# Altium schematic symbol library TI - ADC.SchLib: 2198 symbols (part 18 of 130)
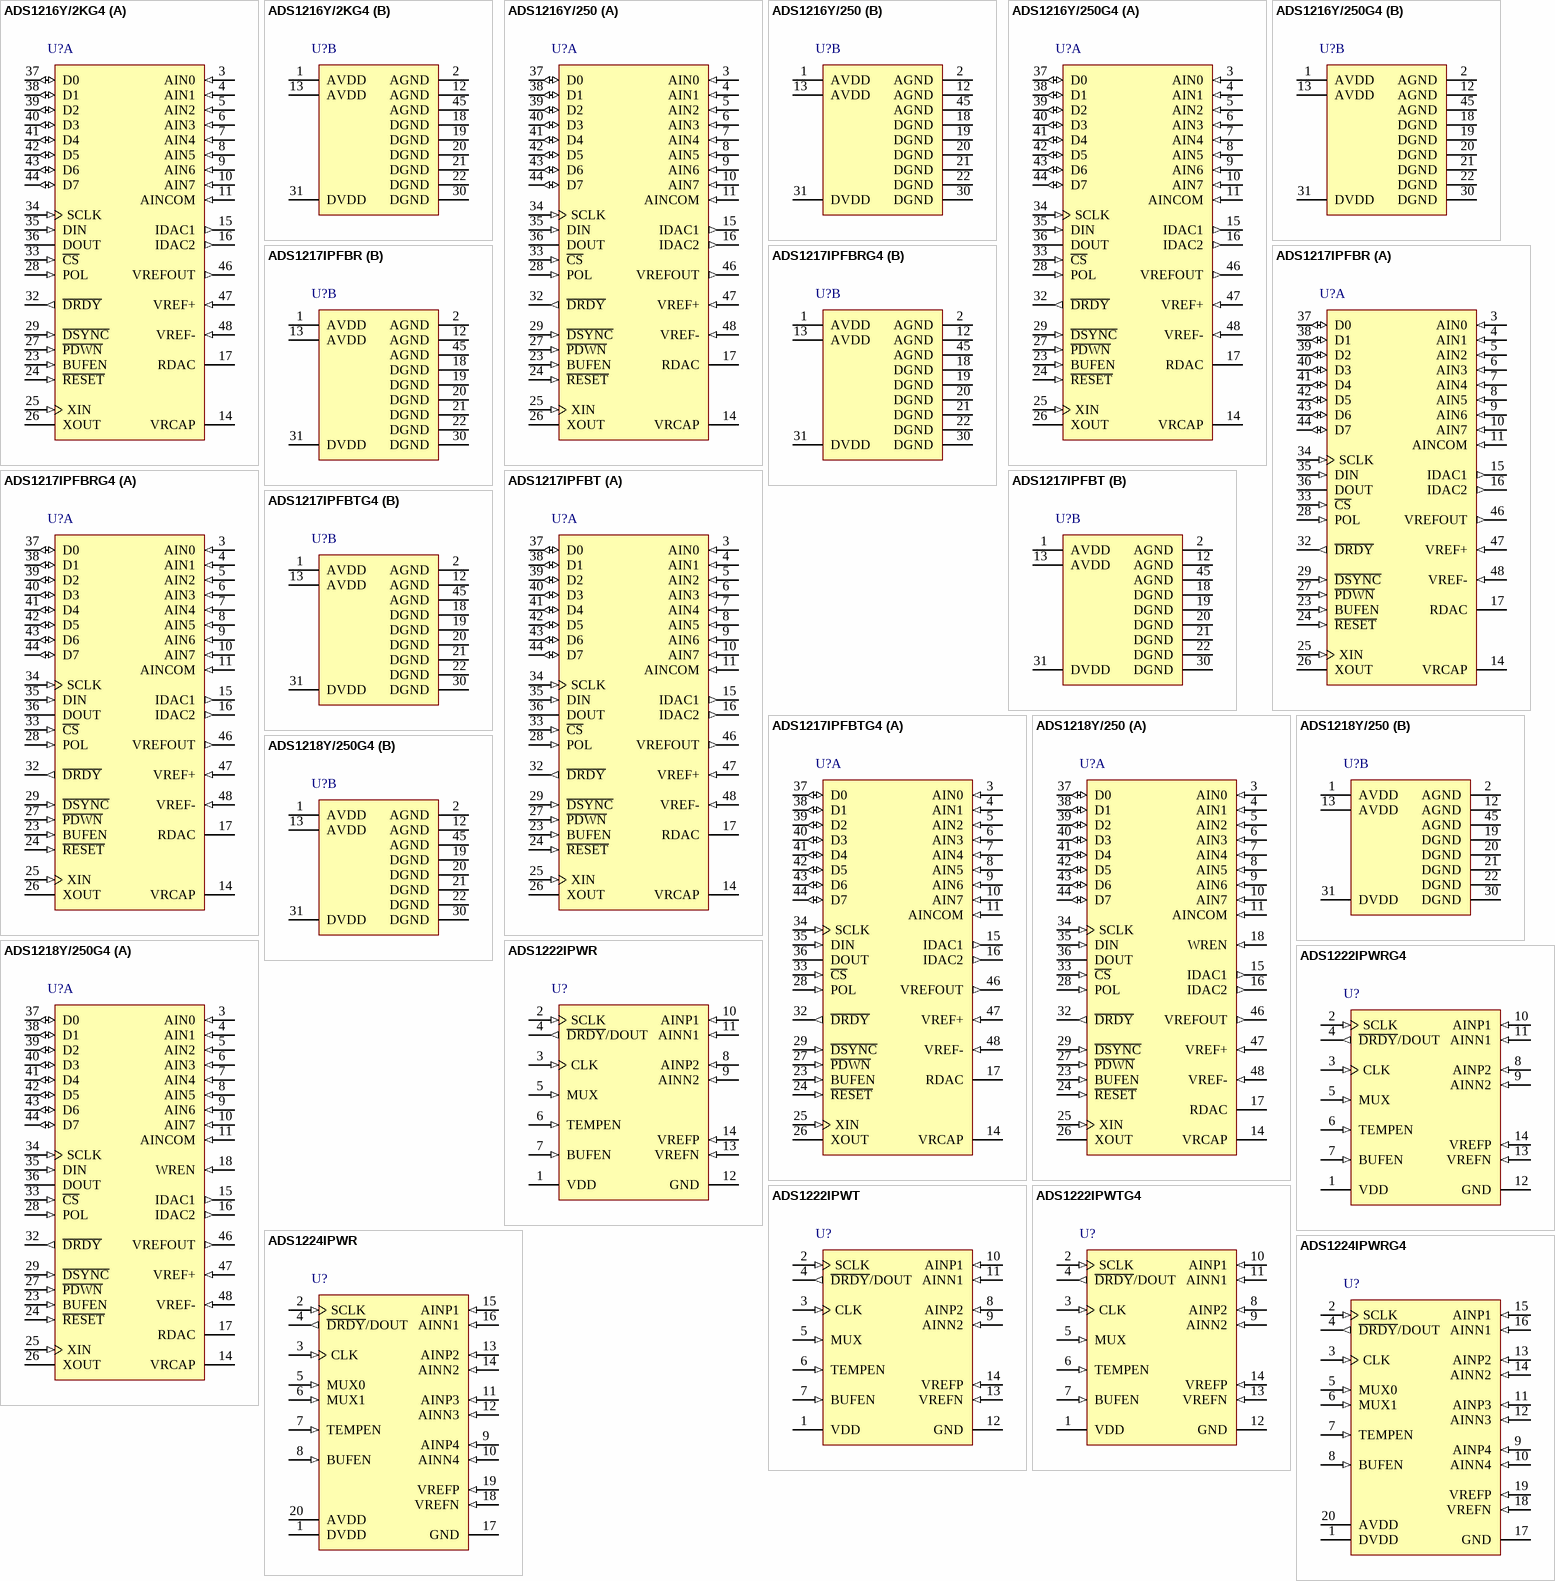
[diagram p143: symbols ADS1216Y/2KG4 to ADS1224IPWRG4]

## ADS1216Y/2KG4
designator U?
24-Bit ADC, -40 to 85 degC, 48-pin QFP (PFB48), Green (RoHS & no Sb/Br); Manufacturer: Texas Instruments; PartNumber: ADS1216Y/2KG4; # Input Channels: 8; Analog Voltage AV/DD(Max)(V): 5.25; Analog Voltage AV/DD(Min)(V): 2.7; Architecture: Delta-Sigma; ENOB(Bits): 22; Interface: Serial SPI; Resolution(Bits): 24; Sample Rate (max)(SPS): 780; SubFamily: Precision ADC (<=10MSPS); DatasheetVersion: SBAS171D; PackageVersion: 4073176/B, 10/1996; PackageReference: PFB48; PackageDescription: 48-Pin Plastic Flat Pack, Body 7 x 7 mm, Pitch 0.5 mm; Supplier 1: Digi-Key; Supplier Part Number 1: ADS8344NG4-ND; Digital Supply(Max)(V): 5.25; Digital Supply(Min)(V): 2.7; Eco-Plan: Green (RoHS & no Sb/Br); Mounting Technology: Surface Mount; Code_JEDEC: MS-026; ComponentLink1Description: Manufacturer URL; ComponentLink1URL: http://www.ti.com/; ComponentLink2Description: Datasheet; ComponentLink2URL: http://www.ti.com/general/docs/lit/getliterature.tsp?genericPartNumber=ADS1216&fileType=pdf; ComponentLink3Description: Package Specification; ComponentLink3URL: http://www.ti.com/lit/ml/mtqf019a/mtqf019a.pdf
footprint TI-PFB48_N (QFP, 48-Leads, Body 7x7mm, Pitch 0.5mm, IPC Medium Density)
footprint TI-PFB48_L (QFP, 48-Leads, Body 7x7mm, Pitch 0.5mm, IPC High Density)
footprint TI-PFB48_M (QFP, 48-Leads, Body 7x7mm, Pitch 0.5mm, IPC Low Density)
part A pins: 3 AIN0 (in) "Analog Input 0", 4 AIN1 (in) "Analog Input 1", 5 AIN2 (in) "Analog Input 2", 6 AIN3 (in) "Analog Input 3", 7 AIN4 (in) "Analog Input 4", 8 AIN5 (in) "Analog Input 5", 9 AIN6 (in) "Analog Input 6", 10 AIN7 (in) "Analog Input 7", 11 AINCOM (in) "Analog Input Common", 14 VRCAP "VREFOUT Bypass Capacitor", 15 IDAC1 (out) "Current DAC1 Output", 16 IDAC2 (out) "Current DAC2 Output", 17 RDAC "Current DAC Resistor", 23 BUFEN (in) "Buffer Enable Input", 24 ~{RESET} (in) "Active LOW, resets the entire chip.", 25 XIN (in) "Clock Input", 26 XOUT "Clock Output, used with crystal or resonator.", 27 ~{PDWN} (in) "Active LOW. Power Down. The power-down function shuts down the analog and digital circuits", 28 POL (in) "Serial Clock Polarity Input", 29 ~{DSYNC} (in) "Active LOW, Synchronization Control Input", 32 ~{DRDY} (out) "Active LOW, Data Ready Output", 33 ~{CS} (in) "Active LOW, Chip Select Input", 34 SCLK (in) "Serial Clock, Schmitt Trigger", 35 DIN (in) "Serial Data Input, Schmitt Trigger", 36 DOUT (hiz) "Serial Data Output", 37 D0 (io) "Digital I/O 0", 38 D1 (io) "Digital I/O 1", 39 D2 (io) "Digital I/O 2", 40 D3 (io) "Digital I/O 3", 41 D4 (io) "Digital I/O 4", 42 D5 (io) "Digital I/O 5", 43 D6 (io) "Digital I/O 6", 44 D7 (io) "Digital I/O 7", 46 VREFOUT (out) "Voltage Reference Output", 47 VREF+ (in) "Positive Differential Reference Input", 48 VREF- (in) "Negative Differential Reference Input"
part B pins: 1 AVDD (power) "Analog Power Supply", 2 AGND (power) "Analog Ground", 12 AGND (power) "Analog Ground", 13 AVDD (power) "Analog Power Supply", 18 DGND (power) "Digital Ground", 19 DGND (power) "Digital Ground", 20 DGND (power) "Digital Ground", 21 DGND (power) "Digital Ground", 22 DGND (power) "Digital Ground", 30 DGND (power) "Digital Ground", 31 DVDD (power) "Digital Power Supply", 45 AGND (power) "Analog Ground"

## ADS1216Y/250
designator U?
24-Bit ADC, -40 to 85 degC, 48-pin QFP (PFB48), Green (RoHS & no Sb/Br); Manufacturer: Texas Instruments; PartNumber: ADS1216Y/250; # Input Channels: 8; Analog Voltage AV/DD(Max)(V): 5.25; Analog Voltage AV/DD(Min)(V): 2.7; Architecture: Delta-Sigma; ENOB(Bits): 22; Interface: Serial SPI; Resolution(Bits): 24; Sample Rate (max)(SPS): 780; SubFamily: Precision ADC (<=10MSPS); DatasheetVersion: SBAS171D; PackageVersion: 4073176/B, 10/1996; PackageReference: PFB48; PackageDescription: 48-Pin Plastic Flat Pack, Body 7 x 7 mm, Pitch 0.5 mm; Supplier 1: Digi-Key; Supplier Part Number 1: ADS1254E/2K5TR-ND; Digital Supply(Max)(V): 5.25; Digital Supply(Min)(V): 2.7; Eco-Plan: Green (RoHS & no Sb/Br); Mounting Technology: Surface Mount; Code_JEDEC: MS-026; ComponentLink1Description: Manufacturer URL; ComponentLink1URL: http://www.ti.com/; ComponentLink2Description: Datasheet; ComponentLink2URL: http://www.ti.com/general/docs/lit/getliterature.tsp?genericPartNumber=ADS1216&fileType=pdf; ComponentLink3Description: Package Specification; ComponentLink3URL: http://www.ti.com/lit/ml/mtqf019a/mtqf019a.pdf
footprint TI-PFB48_N (QFP, 48-Leads, Body 7x7mm, Pitch 0.5mm, IPC Medium Density)
footprint TI-PFB48_L (QFP, 48-Leads, Body 7x7mm, Pitch 0.5mm, IPC High Density)
footprint TI-PFB48_M (QFP, 48-Leads, Body 7x7mm, Pitch 0.5mm, IPC Low Density)
part A pins: 3 AIN0 (in) "Analog Input 0", 4 AIN1 (in) "Analog Input 1", 5 AIN2 (in) "Analog Input 2", 6 AIN3 (in) "Analog Input 3", 7 AIN4 (in) "Analog Input 4", 8 AIN5 (in) "Analog Input 5", 9 AIN6 (in) "Analog Input 6", 10 AIN7 (in) "Analog Input 7", 11 AINCOM (in) "Analog Input Common", 14 VRCAP "VREFOUT Bypass Capacitor", 15 IDAC1 (out) "Current DAC1 Output", 16 IDAC2 (out) "Current DAC2 Output", 17 RDAC "Current DAC Resistor", 23 BUFEN (in) "Buffer Enable Input", 24 ~{RESET} (in) "Active LOW, resets the entire chip.", 25 XIN (in) "Clock Input", 26 XOUT "Clock Output, used with crystal or resonator.", 27 ~{PDWN} (in) "Active LOW. Power Down. The power-down function shuts down the analog and digital circuits", 28 POL (in) "Serial Clock Polarity Input", 29 ~{DSYNC} (in) "Active LOW, Synchronization Control Input", 32 ~{DRDY} (out) "Active LOW, Data Ready Output", 33 ~{CS} (in) "Active LOW, Chip Select Input", 34 SCLK (in) "Serial Clock, Schmitt Trigger", 35 DIN (in) "Serial Data Input, Schmitt Trigger", 36 DOUT (hiz) "Serial Data Output", 37 D0 (io) "Digital I/O 0", 38 D1 (io) "Digital I/O 1", 39 D2 (io) "Digital I/O 2", 40 D3 (io) "Digital I/O 3", 41 D4 (io) "Digital I/O 4", 42 D5 (io) "Digital I/O 5", 43 D6 (io) "Digital I/O 6", 44 D7 (io) "Digital I/O 7", 46 VREFOUT (out) "Voltage Reference Output", 47 VREF+ (in) "Positive Differential Reference Input", 48 VREF- (in) "Negative Differential Reference Input"
part B pins: 1 AVDD (power) "Analog Power Supply", 2 AGND (power) "Analog Ground", 12 AGND (power) "Analog Ground", 13 AVDD (power) "Analog Power Supply", 18 DGND (power) "Digital Ground", 19 DGND (power) "Digital Ground", 20 DGND (power) "Digital Ground", 21 DGND (power) "Digital Ground", 22 DGND (power) "Digital Ground", 30 DGND (power) "Digital Ground", 31 DVDD (power) "Digital Power Supply", 45 AGND (power) "Analog Ground"

## ADS1216Y/250G4
designator U?
24-Bit ADC, -40 to 85 degC, 48-pin QFP (PFB48), Green (RoHS & no Sb/Br); Manufacturer: Texas Instruments; PartNumber: ADS1216Y/250G4; # Input Channels: 8; Analog Voltage AV/DD(Max)(V): 5.25; Analog Voltage AV/DD(Min)(V): 2.7; Architecture: Delta-Sigma; ENOB(Bits): 22; Interface: Serial SPI; Resolution(Bits): 24; Sample Rate (max)(SPS): 780; SubFamily: Precision ADC (<=10MSPS); DatasheetVersion: SBAS171D; PackageVersion: 4073176/B, 10/1996; PackageReference: PFB48; PackageDescription: 48-Pin Plastic Flat Pack, Body 7 x 7 mm, Pitch 0.5 mm; Supplier 1: Digi-Key; Supplier Part Number 1: ADS1254E/2K5G4-ND; Digital Supply(Max)(V): 5.25; Digital Supply(Min)(V): 2.7; Eco-Plan: Green (RoHS & no Sb/Br); Mounting Technology: Surface Mount; Code_JEDEC: MS-026; ComponentLink1Description: Manufacturer URL; ComponentLink1URL: http://www.ti.com/; ComponentLink2Description: Datasheet; ComponentLink2URL: http://www.ti.com/general/docs/lit/getliterature.tsp?genericPartNumber=ADS1216&fileType=pdf; ComponentLink3Description: Package Specification; ComponentLink3URL: http://www.ti.com/lit/ml/mtqf019a/mtqf019a.pdf
footprint TI-PFB48_N (QFP, 48-Leads, Body 7x7mm, Pitch 0.5mm, IPC Medium Density)
footprint TI-PFB48_L (QFP, 48-Leads, Body 7x7mm, Pitch 0.5mm, IPC High Density)
footprint TI-PFB48_M (QFP, 48-Leads, Body 7x7mm, Pitch 0.5mm, IPC Low Density)
part A pins: 3 AIN0 (in) "Analog Input 0", 4 AIN1 (in) "Analog Input 1", 5 AIN2 (in) "Analog Input 2", 6 AIN3 (in) "Analog Input 3", 7 AIN4 (in) "Analog Input 4", 8 AIN5 (in) "Analog Input 5", 9 AIN6 (in) "Analog Input 6", 10 AIN7 (in) "Analog Input 7", 11 AINCOM (in) "Analog Input Common", 14 VRCAP "VREFOUT Bypass Capacitor", 15 IDAC1 (out) "Current DAC1 Output", 16 IDAC2 (out) "Current DAC2 Output", 17 RDAC "Current DAC Resistor", 23 BUFEN (in) "Buffer Enable Input", 24 ~{RESET} (in) "Active LOW, resets the entire chip.", 25 XIN (in) "Clock Input", 26 XOUT "Clock Output, used with crystal or resonator.", 27 ~{PDWN} (in) "Active LOW. Power Down. The power-down function shuts down the analog and digital circuits", 28 POL (in) "Serial Clock Polarity Input", 29 ~{DSYNC} (in) "Active LOW, Synchronization Control Input", 32 ~{DRDY} (out) "Active LOW, Data Ready Output", 33 ~{CS} (in) "Active LOW, Chip Select Input", 34 SCLK (in) "Serial Clock, Schmitt Trigger", 35 DIN (in) "Serial Data Input, Schmitt Trigger", 36 DOUT (hiz) "Serial Data Output", 37 D0 (io) "Digital I/O 0", 38 D1 (io) "Digital I/O 1", 39 D2 (io) "Digital I/O 2", 40 D3 (io) "Digital I/O 3", 41 D4 (io) "Digital I/O 4", 42 D5 (io) "Digital I/O 5", 43 D6 (io) "Digital I/O 6", 44 D7 (io) "Digital I/O 7", 46 VREFOUT (out) "Voltage Reference Output", 47 VREF+ (in) "Positive Differential Reference Input", 48 VREF- (in) "Negative Differential Reference Input"
part B pins: 1 AVDD (power) "Analog Power Supply", 2 AGND (power) "Analog Ground", 12 AGND (power) "Analog Ground", 13 AVDD (power) "Analog Power Supply", 18 DGND (power) "Digital Ground", 19 DGND (power) "Digital Ground", 20 DGND (power) "Digital Ground", 21 DGND (power) "Digital Ground", 22 DGND (power) "Digital Ground", 30 DGND (power) "Digital Ground", 31 DVDD (power) "Digital Power Supply", 45 AGND (power) "Analog Ground"

## ADS1217IPFBR
designator U?
8-Channel, 24-Bit ADC, -40 to 85 degC, 48-pin QFP (PFB48), Green (RoHS & no Sb/Br); Manufacturer: Texas Instruments; PartNumber: ADS1217IPFBR; # Input Channels: 8; Analog Voltage AV/DD(Max)(V): 5.25; Analog Voltage AV/DD(Min)(V): 2.7; Architecture: Delta-Sigma; ENOB(Bits): 22; Interface: Serial SPI; Resolution(Bits): 24; Sample Rate (max)(SPS): 780; SubFamily: Precision ADC (<=10MSPS); DatasheetVersion: SBAS260C; PackageVersion: 4073176/B, 10/1996; PackageReference: PFB48; PackageDescription: 48-Pin Plastic Flat Pack, Body 7 x 7 mm, Pitch 0.5 mm; Supplier 1: Digi-Key; Supplier Part Number 1: ADS1254EG4-ND; Digital Supply(Max)(V): 5.25; Digital Supply(Min)(V): 2.7; Eco-Plan: Green (RoHS & no Sb/Br); Mounting Technology: Surface Mount; Code_JEDEC: MS-026; ComponentLink1Description: Manufacturer URL; ComponentLink1URL: http://www.ti.com/; ComponentLink2Description: Datasheet; ComponentLink2URL: http://www.ti.com/general/docs/lit/getliterature.tsp?genericPartNumber=ADS1217&fileType=pdf; ComponentLink3Description: Package Specification; ComponentLink3URL: http://www.ti.com/lit/ml/mtqf019a/mtqf019a.pdf
footprint TI-PFB48_N (QFP, 48-Leads, Body 7x7mm, Pitch 0.5mm, IPC Medium Density)
footprint TI-PFB48_L (QFP, 48-Leads, Body 7x7mm, Pitch 0.5mm, IPC High Density)
footprint TI-PFB48_M (QFP, 48-Leads, Body 7x7mm, Pitch 0.5mm, IPC Low Density)
part A pins: 3 AIN0 (in) "Analog Input 0", 4 AIN1 (in) "Analog Input 1", 5 AIN2 (in) "Analog Input 2", 6 AIN3 (in) "Analog Input 3", 7 AIN4 (in) "Analog Input 4", 8 AIN5 (in) "Analog Input 5", 9 AIN6 (in) "Analog Input 6", 10 AIN7 (in) "Analog Input 7", 11 AINCOM (in) "Analog Input Common", 14 VRCAP "VREFOUT Bypass Capacitor", 15 IDAC1 (out) "Current DAC1 Output", 16 IDAC2 (out) "Current DAC2 Output", 17 RDAC "Current DAC Resistor", 23 BUFEN (in) "Buffer Enable Input", 24 ~{RESET} (in) "Active LOW, resets the entire chip.", 25 XIN (in) "Clock Input", 26 XOUT "Clock Output, used with crystal or resonator.", 27 ~{PDWN} (in) "Active LOW. Power Down. The power-down function shuts down the analog and digital circuits", 28 POL (in) "Serial Clock Polarity Input", 29 ~{DSYNC} (in) "Active LOW, Synchronization Control Input", 32 ~{DRDY} (out) "Active LOW, Data Ready Output", 33 ~{CS} (in) "Active LOW, Chip Select Input", 34 SCLK (in) "Serial Clock, Schmitt Trigger", 35 DIN (in) "Serial Data Input, Schmitt Trigger", 36 DOUT (hiz) "Serial Data Output", 37 D0 (io) "Digital I/O 0", 38 D1 (io) "Digital I/O 1", 39 D2 (io) "Digital I/O 2", 40 D3 (io) "Digital I/O 3", 41 D4 (io) "Digital I/O 4", 42 D5 (io) "Digital I/O 5", 43 D6 (io) "Digital I/O 6", 44 D7 (io) "Digital I/O 7", 46 VREFOUT (out) "Voltage Reference Output", 47 VREF+ (in) "Positive Differential Reference Input", 48 VREF- (in) "Negative Differential Reference Input"
part B pins: 1 AVDD (power) "Analog Power Supply", 2 AGND (power) "Analog Ground", 12 AGND (power) "Analog Ground", 13 AVDD (power) "Analog Power Supply", 18 DGND (power) "Digital Ground", 19 DGND (power) "Digital Ground", 20 DGND (power) "Digital Ground", 21 DGND (power) "Digital Ground", 22 DGND (power) "Digital Ground", 30 DGND (power) "Digital Ground", 31 DVDD (power) "Digital Power Supply", 45 AGND (power) "Analog Ground"

## ADS1217IPFBRG4
designator U?
8-Channel, 24-Bit ADC, -40 to 85 degC, 48-pin QFP (PFB48), Green (RoHS & no Sb/Br); Manufacturer: Texas Instruments; PartNumber: ADS1217IPFBRG4; # Input Channels: 8; Analog Voltage AV/DD(Max)(V): 5.25; Analog Voltage AV/DD(Min)(V): 2.7; Architecture: Delta-Sigma; ENOB(Bits): 22; Interface: Serial SPI; Resolution(Bits): 24; Sample Rate (max)(SPS): 780; SubFamily: Precision ADC (<=10MSPS); DatasheetVersion: SBAS260C; PackageVersion: 4073176/B, 10/1996; PackageReference: PFB48; PackageDescription: 48-Pin Plastic Flat Pack, Body 7 x 7 mm, Pitch 0.5 mm; Supplier 1: Digi-Key; Supplier Part Number 1: ADS8345E-ND; Digital Supply(Max)(V): 5.25; Digital Supply(Min)(V): 2.7; Eco-Plan: Green (RoHS & no Sb/Br); Mounting Technology: Surface Mount; Code_JEDEC: MS-026; ComponentLink1Description: Manufacturer URL; ComponentLink1URL: http://www.ti.com/; ComponentLink2Description: Datasheet; ComponentLink2URL: http://www.ti.com/general/docs/lit/getliterature.tsp?genericPartNumber=ADS1217&fileType=pdf; ComponentLink3Description: Package Specification; ComponentLink3URL: http://www.ti.com/lit/ml/mtqf019a/mtqf019a.pdf
footprint TI-PFB48_N (QFP, 48-Leads, Body 7x7mm, Pitch 0.5mm, IPC Medium Density)
footprint TI-PFB48_L (QFP, 48-Leads, Body 7x7mm, Pitch 0.5mm, IPC High Density)
footprint TI-PFB48_M (QFP, 48-Leads, Body 7x7mm, Pitch 0.5mm, IPC Low Density)
part A pins: 3 AIN0 (in) "Analog Input 0", 4 AIN1 (in) "Analog Input 1", 5 AIN2 (in) "Analog Input 2", 6 AIN3 (in) "Analog Input 3", 7 AIN4 (in) "Analog Input 4", 8 AIN5 (in) "Analog Input 5", 9 AIN6 (in) "Analog Input 6", 10 AIN7 (in) "Analog Input 7", 11 AINCOM (in) "Analog Input Common", 14 VRCAP "VREFOUT Bypass Capacitor", 15 IDAC1 (out) "Current DAC1 Output", 16 IDAC2 (out) "Current DAC2 Output", 17 RDAC "Current DAC Resistor", 23 BUFEN (in) "Buffer Enable Input", 24 ~{RESET} (in) "Active LOW, resets the entire chip.", 25 XIN (in) "Clock Input", 26 XOUT "Clock Output, used with crystal or resonator.", 27 ~{PDWN} (in) "Active LOW. Power Down. The power-down function shuts down the analog and digital circuits", 28 POL (in) "Serial Clock Polarity Input", 29 ~{DSYNC} (in) "Active LOW, Synchronization Control Input", 32 ~{DRDY} (out) "Active LOW, Data Ready Output", 33 ~{CS} (in) "Active LOW, Chip Select Input", 34 SCLK (in) "Serial Clock, Schmitt Trigger", 35 DIN (in) "Serial Data Input, Schmitt Trigger", 36 DOUT (hiz) "Serial Data Output", 37 D0 (io) "Digital I/O 0", 38 D1 (io) "Digital I/O 1", 39 D2 (io) "Digital I/O 2", 40 D3 (io) "Digital I/O 3", 41 D4 (io) "Digital I/O 4", 42 D5 (io) "Digital I/O 5", 43 D6 (io) "Digital I/O 6", 44 D7 (io) "Digital I/O 7", 46 VREFOUT (out) "Voltage Reference Output", 47 VREF+ (in) "Positive Differential Reference Input", 48 VREF- (in) "Negative Differential Reference Input"
part B pins: 1 AVDD (power) "Analog Power Supply", 2 AGND (power) "Analog Ground", 12 AGND (power) "Analog Ground", 13 AVDD (power) "Analog Power Supply", 18 DGND (power) "Digital Ground", 19 DGND (power) "Digital Ground", 20 DGND (power) "Digital Ground", 21 DGND (power) "Digital Ground", 22 DGND (power) "Digital Ground", 30 DGND (power) "Digital Ground", 31 DVDD (power) "Digital Power Supply", 45 AGND (power) "Analog Ground"

## ADS1217IPFBT
designator U?
8-Channel, 24-Bit ADC, -40 to 85 degC, 48-pin QFP (PFB48), Green (RoHS & no Sb/Br); Manufacturer: Texas Instruments; PartNumber: ADS1217IPFBT; # Input Channels: 8; Analog Voltage AV/DD(Max)(V): 5.25; Analog Voltage AV/DD(Min)(V): 2.7; Architecture: Delta-Sigma; ENOB(Bits): 22; Interface: Serial SPI; Resolution(Bits): 24; Sample Rate (max)(SPS): 780; SubFamily: Precision ADC (<=10MSPS); DatasheetVersion: SBAS260C; PackageVersion: 4073176/B, 10/1996; PackageReference: PFB48; PackageDescription: 48-Pin Plastic Flat Pack, Body 7 x 7 mm, Pitch 0.5 mm; Supplier 1: Digi-Key; Supplier Part Number 1: ADS8345E/2K5-ND; Digital Supply(Max)(V): 5.25; Digital Supply(Min)(V): 2.7; Eco-Plan: Green (RoHS & no Sb/Br); Mounting Technology: Surface Mount; Code_JEDEC: MS-026; ComponentLink1Description: Manufacturer URL; ComponentLink1URL: http://www.ti.com/; ComponentLink2Description: Datasheet; ComponentLink2URL: http://www.ti.com/general/docs/lit/getliterature.tsp?genericPartNumber=ADS1217&fileType=pdf; ComponentLink3Description: Package Specification; ComponentLink3URL: http://www.ti.com/lit/ml/mtqf019a/mtqf019a.pdf
footprint TI-PFB48_N (QFP, 48-Leads, Body 7x7mm, Pitch 0.5mm, IPC Medium Density)
footprint TI-PFB48_L (QFP, 48-Leads, Body 7x7mm, Pitch 0.5mm, IPC High Density)
footprint TI-PFB48_M (QFP, 48-Leads, Body 7x7mm, Pitch 0.5mm, IPC Low Density)
part A pins: 3 AIN0 (in) "Analog Input 0", 4 AIN1 (in) "Analog Input 1", 5 AIN2 (in) "Analog Input 2", 6 AIN3 (in) "Analog Input 3", 7 AIN4 (in) "Analog Input 4", 8 AIN5 (in) "Analog Input 5", 9 AIN6 (in) "Analog Input 6", 10 AIN7 (in) "Analog Input 7", 11 AINCOM (in) "Analog Input Common", 14 VRCAP "VREFOUT Bypass Capacitor", 15 IDAC1 (out) "Current DAC1 Output", 16 IDAC2 (out) "Current DAC2 Output", 17 RDAC "Current DAC Resistor", 23 BUFEN (in) "Buffer Enable Input", 24 ~{RESET} (in) "Active LOW, resets the entire chip.", 25 XIN (in) "Clock Input", 26 XOUT "Clock Output, used with crystal or resonator.", 27 ~{PDWN} (in) "Active LOW. Power Down. The power-down function shuts down the analog and digital circuits", 28 POL (in) "Serial Clock Polarity Input", 29 ~{DSYNC} (in) "Active LOW, Synchronization Control Input", 32 ~{DRDY} (out) "Active LOW, Data Ready Output", 33 ~{CS} (in) "Active LOW, Chip Select Input", 34 SCLK (in) "Serial Clock, Schmitt Trigger", 35 DIN (in) "Serial Data Input, Schmitt Trigger", 36 DOUT (hiz) "Serial Data Output", 37 D0 (io) "Digital I/O 0", 38 D1 (io) "Digital I/O 1", 39 D2 (io) "Digital I/O 2", 40 D3 (io) "Digital I/O 3", 41 D4 (io) "Digital I/O 4", 42 D5 (io) "Digital I/O 5", 43 D6 (io) "Digital I/O 6", 44 D7 (io) "Digital I/O 7", 46 VREFOUT (out) "Voltage Reference Output", 47 VREF+ (in) "Positive Differential Reference Input", 48 VREF- (in) "Negative Differential Reference Input"
part B pins: 1 AVDD (power) "Analog Power Supply", 2 AGND (power) "Analog Ground", 12 AGND (power) "Analog Ground", 13 AVDD (power) "Analog Power Supply", 18 DGND (power) "Digital Ground", 19 DGND (power) "Digital Ground", 20 DGND (power) "Digital Ground", 21 DGND (power) "Digital Ground", 22 DGND (power) "Digital Ground", 30 DGND (power) "Digital Ground", 31 DVDD (power) "Digital Power Supply", 45 AGND (power) "Analog Ground"

## ADS1217IPFBTG4
designator U?
8-Channel, 24-Bit ADC, -40 to 85 degC, 48-pin QFP (PFB48), Green (RoHS & no Sb/Br); Manufacturer: Texas Instruments; PartNumber: ADS1217IPFBTG4; # Input Channels: 8; Analog Voltage AV/DD(Max)(V): 5.25; Analog Voltage AV/DD(Min)(V): 2.7; Architecture: Delta-Sigma; ENOB(Bits): 22; Interface: Serial SPI; Resolution(Bits): 24; Sample Rate (max)(SPS): 780; SubFamily: Precision ADC (<=10MSPS); DatasheetVersion: SBAS260C; PackageVersion: 4073176/B, 10/1996; PackageReference: PFB48; PackageDescription: 48-Pin Plastic Flat Pack, Body 7 x 7 mm, Pitch 0.5 mm; Supplier 1: Digi-Key; Supplier Part Number 1: ADS8345E/2K5G4-ND; Digital Supply(Max)(V): 5.25; Digital Supply(Min)(V): 2.7; Eco-Plan: Green (RoHS & no Sb/Br); Mounting Technology: Surface Mount; Code_JEDEC: MS-026; ComponentLink1Description: Manufacturer URL; ComponentLink1URL: http://www.ti.com/; ComponentLink2Description: Datasheet; ComponentLink2URL: http://www.ti.com/general/docs/lit/getliterature.tsp?genericPartNumber=ADS1217&fileType=pdf; ComponentLink3Description: Package Specification; ComponentLink3URL: http://www.ti.com/lit/ml/mtqf019a/mtqf019a.pdf
footprint TI-PFB48_N (QFP, 48-Leads, Body 7x7mm, Pitch 0.5mm, IPC Medium Density)
footprint TI-PFB48_L (QFP, 48-Leads, Body 7x7mm, Pitch 0.5mm, IPC High Density)
footprint TI-PFB48_M (QFP, 48-Leads, Body 7x7mm, Pitch 0.5mm, IPC Low Density)
part A pins: 3 AIN0 (in) "Analog Input 0", 4 AIN1 (in) "Analog Input 1", 5 AIN2 (in) "Analog Input 2", 6 AIN3 (in) "Analog Input 3", 7 AIN4 (in) "Analog Input 4", 8 AIN5 (in) "Analog Input 5", 9 AIN6 (in) "Analog Input 6", 10 AIN7 (in) "Analog Input 7", 11 AINCOM (in) "Analog Input Common", 14 VRCAP "VREFOUT Bypass Capacitor", 15 IDAC1 (out) "Current DAC1 Output", 16 IDAC2 (out) "Current DAC2 Output", 17 RDAC "Current DAC Resistor", 23 BUFEN (in) "Buffer Enable Input", 24 ~{RESET} (in) "Active LOW, resets the entire chip.", 25 XIN (in) "Clock Input", 26 XOUT "Clock Output, used with crystal or resonator.", 27 ~{PDWN} (in) "Active LOW. Power Down. The power-down function shuts down the analog and digital circuits", 28 POL (in) "Serial Clock Polarity Input", 29 ~{DSYNC} (in) "Active LOW, Synchronization Control Input", 32 ~{DRDY} (out) "Active LOW, Data Ready Output", 33 ~{CS} (in) "Active LOW, Chip Select Input", 34 SCLK (in) "Serial Clock, Schmitt Trigger", 35 DIN (in) "Serial Data Input, Schmitt Trigger", 36 DOUT (hiz) "Serial Data Output", 37 D0 (io) "Digital I/O 0", 38 D1 (io) "Digital I/O 1", 39 D2 (io) "Digital I/O 2", 40 D3 (io) "Digital I/O 3", 41 D4 (io) "Digital I/O 4", 42 D5 (io) "Digital I/O 5", 43 D6 (io) "Digital I/O 6", 44 D7 (io) "Digital I/O 7", 46 VREFOUT (out) "Voltage Reference Output", 47 VREF+ (in) "Positive Differential Reference Input", 48 VREF- (in) "Negative Differential Reference Input"
part B pins: 1 AVDD (power) "Analog Power Supply", 2 AGND (power) "Analog Ground", 12 AGND (power) "Analog Ground", 13 AVDD (power) "Analog Power Supply", 18 DGND (power) "Digital Ground", 19 DGND (power) "Digital Ground", 20 DGND (power) "Digital Ground", 21 DGND (power) "Digital Ground", 22 DGND (power) "Digital Ground", 30 DGND (power) "Digital Ground", 31 DVDD (power) "Digital Power Supply", 45 AGND (power) "Analog Ground"

## ADS1218Y/250
designator U?
24-Bit, 780 SPS ADC with Flash Memory, 8 Channel, Vref, Buffer, 2 IDAC, Serial Out, Digital I/O, Low Power, -40 to 85 degC, 48-pin QFP (PFB48), Green (RoHS & no Sb/Br); Manufacturer: Texas Instruments; PartNumber: ADS1218Y/250; # Input Channels: 8; Analog Voltage AV/DD(Max)(V): 5.25; Analog Voltage AV/DD(Min)(V): 2.7; Architecture: Delta-Sigma; ENOB(Bits): 22; Interface: Serial SPI; Resolution(Bits): 24; Sample Rate (max)(SPS): 780; SubFamily: Precision ADC (<=10MSPS); DatasheetVersion: SBAS187C; PackageVersion: 4073176/B, 10/1996; PackageReference: PFB48; PackageDescription: 48-Pin Plastic Flat Pack, Body 7 x 7 mm, Pitch 0.5 mm; Supplier 1: Digi-Key; Supplier Part Number 1: 296-32825-5-ND; Digital Supply(Max)(V): 5.25; Digital Supply(Min)(V): 2.7; Eco-Plan: Green (RoHS & no Sb/Br); Mounting Technology: Surface Mount; Code_JEDEC: MS-026; ComponentLink1Description: Manufacturer URL; ComponentLink1URL: http://www.ti.com/; ComponentLink2Description: Datasheet; ComponentLink2URL: http://www.ti.com/general/docs/lit/getliterature.tsp?genericPartNumber=ADS1218&fileType=pdf; ComponentLink3Description: Package Specification; ComponentLink3URL: http://www.ti.com/lit/ml/mtqf019a/mtqf019a.pdf
footprint TI-PFB48_N (QFP, 48-Leads, Body 7x7mm, Pitch 0.5mm, IPC Medium Density)
footprint TI-PFB48_L (QFP, 48-Leads, Body 7x7mm, Pitch 0.5mm, IPC High Density)
footprint TI-PFB48_M (QFP, 48-Leads, Body 7x7mm, Pitch 0.5mm, IPC Low Density)
part A pins: 3 AIN0 (in) "Analog Input 0", 4 AIN1 (in) "Analog Input 1", 5 AIN2 (in) "Analog Input 2", 6 AIN3 (in) "Analog Input 3", 7 AIN4 (in) "Analog Input 4", 8 AIN5 (in) "Analog Input 5", 9 AIN6 (in) "Analog Input 6", 10 AIN7 (in) "Analog Input 7", 11 AINCOM (in) "Analog Input Common", 14 VRCAP "VREFOUT Bypass Capacitor", 15 IDAC1 (out) "Current DAC1 Output", 16 IDAC2 (out) "Current DAC2 Output", 17 RDAC "Current DAC Resistor", 18 WREN (in) "Active High, Flash Write Enable", 23 BUFEN (in) "Buffer Enable Input", 24 ~{RESET} (in) "Active LOW, resets the entire chip.", 25 XIN (in) "Clock Input", 26 XOUT "Clock Output, used with crystal or resonator.", 27 ~{PDWN} (in) "Active LOW. Power Down. The power-down function shuts down the analog and digital circuits", 28 POL (in) "Serial Clock Polarity Input", 29 ~{DSYNC} (in) "Active LOW, Synchronization Control Input", 32 ~{DRDY} (out) "Active LOW, Data Ready Output", 33 ~{CS} (in) "Active LOW, Chip Select Input", 34 SCLK (in) "Serial Clock, Schmitt Trigger", 35 DIN (in) "Serial Data Input, Schmitt Trigger", 36 DOUT (hiz) "Serial Data Output", 37 D0 (io) "Digital I/O 0", 38 D1 (io) "Digital I/O 1", 39 D2 (io) "Digital I/O 2", 40 D3 (io) "Digital I/O 3", 41 D4 (io) "Digital I/O 4", 42 D5 (io) "Digital I/O 5", 43 D6 (io) "Digital I/O 6", 44 D7 (io) "Digital I/O 7", 46 VREFOUT (out) "Voltage Reference Output", 47 VREF+ (in) "Positive Differential Reference Input", 48 VREF- (in) "Negative Differential Reference Input"
part B pins: 1 AVDD (power) "Analog Power Supply", 2 AGND (power) "Analog Ground", 12 AGND (power) "Analog Ground", 13 AVDD (power) "Analog Power Supply", 19 DGND (power) "Digital Ground", 20 DGND (power) "Digital Ground", 21 DGND (power) "Digital Ground", 22 DGND (power) "Digital Ground", 30 DGND (power) "Digital Ground", 31 DVDD (power) "Digital Power Supply", 45 AGND (power) "Analog Ground"

## ADS1218Y/250G4
designator U?
24-Bit, 780 SPS ADC with Flash Memory, 8 Channel, Vref, Buffer, 2 IDAC, Serial Out, Digital I/O, Low Power, -40 to 85 degC, 48-pin QFP (PFB48), Green (RoHS & no Sb/Br); Manufacturer: Texas Instruments; PartNumber: ADS1218Y/250G4; # Input Channels: 8; Analog Voltage AV/DD(Max)(V): 5.25; Analog Voltage AV/DD(Min)(V): 2.7; Architecture: Delta-Sigma; ENOB(Bits): 22; Interface: Serial SPI; Resolution(Bits): 24; Sample Rate (max)(SPS): 780; SubFamily: Precision ADC (<=10MSPS); DatasheetVersion: SBAS187C; PackageVersion: 4073176/B, 10/1996; PackageReference: PFB48; PackageDescription: 48-Pin Plastic Flat Pack, Body 7 x 7 mm, Pitch 0.5 mm; Supplier 1: Digi-Key; Supplier Part Number 1: ADS8345EBE4-ND; Digital Supply(Max)(V): 5.25; Digital Supply(Min)(V): 2.7; Eco-Plan: Green (RoHS & no Sb/Br); Mounting Technology: Surface Mount; Code_JEDEC: MS-026; ComponentLink1Description: Manufacturer URL; ComponentLink1URL: http://www.ti.com/; ComponentLink2Description: Datasheet; ComponentLink2URL: http://www.ti.com/general/docs/lit/getliterature.tsp?genericPartNumber=ADS1218&fileType=pdf; ComponentLink3Description: Package Specification; ComponentLink3URL: http://www.ti.com/lit/ml/mtqf019a/mtqf019a.pdf
footprint TI-PFB48_N (QFP, 48-Leads, Body 7x7mm, Pitch 0.5mm, IPC Medium Density)
footprint TI-PFB48_L (QFP, 48-Leads, Body 7x7mm, Pitch 0.5mm, IPC High Density)
footprint TI-PFB48_M (QFP, 48-Leads, Body 7x7mm, Pitch 0.5mm, IPC Low Density)
part A pins: 3 AIN0 (in) "Analog Input 0", 4 AIN1 (in) "Analog Input 1", 5 AIN2 (in) "Analog Input 2", 6 AIN3 (in) "Analog Input 3", 7 AIN4 (in) "Analog Input 4", 8 AIN5 (in) "Analog Input 5", 9 AIN6 (in) "Analog Input 6", 10 AIN7 (in) "Analog Input 7", 11 AINCOM (in) "Analog Input Common", 14 VRCAP "VREFOUT Bypass Capacitor", 15 IDAC1 (out) "Current DAC1 Output", 16 IDAC2 (out) "Current DAC2 Output", 17 RDAC "Current DAC Resistor", 18 WREN (in) "Active High, Flash Write Enable", 23 BUFEN (in) "Buffer Enable Input", 24 ~{RESET} (in) "Active LOW, resets the entire chip.", 25 XIN (in) "Clock Input", 26 XOUT "Clock Output, used with crystal or resonator.", 27 ~{PDWN} (in) "Active LOW. Power Down. The power-down function shuts down the analog and digital circuits", 28 POL (in) "Serial Clock Polarity Input", 29 ~{DSYNC} (in) "Active LOW, Synchronization Control Input", 32 ~{DRDY} (out) "Active LOW, Data Ready Output", 33 ~{CS} (in) "Active LOW, Chip Select Input", 34 SCLK (in) "Serial Clock, Schmitt Trigger", 35 DIN (in) "Serial Data Input, Schmitt Trigger", 36 DOUT (hiz) "Serial Data Output", 37 D0 (io) "Digital I/O 0", 38 D1 (io) "Digital I/O 1", 39 D2 (io) "Digital I/O 2", 40 D3 (io) "Digital I/O 3", 41 D4 (io) "Digital I/O 4", 42 D5 (io) "Digital I/O 5", 43 D6 (io) "Digital I/O 6", 44 D7 (io) "Digital I/O 7", 46 VREFOUT (out) "Voltage Reference Output", 47 VREF+ (in) "Positive Differential Reference Input", 48 VREF- (in) "Negative Differential Reference Input"
part B pins: 1 AVDD (power) "Analog Power Supply", 2 AGND (power) "Analog Ground", 12 AGND (power) "Analog Ground", 13 AVDD (power) "Analog Power Supply", 19 DGND (power) "Digital Ground", 20 DGND (power) "Digital Ground", 21 DGND (power) "Digital Ground", 22 DGND (power) "Digital Ground", 30 DGND (power) "Digital Ground", 31 DVDD (power) "Digital Power Supply", 45 AGND (power) "Analog Ground"

## ADS1222IPWR
designator U?
24-Bit ADC with 2-Channel Diffrential Input Multiplexer, -40 to 85 degC, 14-pin SOP (PW14), Green (RoHS & no Sb/Br); Manufacturer: Texas Instruments; PartNumber: ADS1222IPWR; # Input Channels: 2; Analog Voltage AV/DD(Max)(V): 5.5; Analog Voltage AV/DD(Min)(V): 2.7; Architecture: Delta-Sigma; ENOB(Bits): 20; Interface: Serial SPI; Resolution(Bits): 24; Sample Rate (max)(SPS): 240; SubFamily: Precision ADC (<=10MSPS); DatasheetVersion: SBAS314B; PackageVersion: 4040064-3/G, 02/2011; PackageReference: PW14; PackageDescription: 14-Pin Plastic Small Outline, Body 5 x 4.4 mm, Pitch 0.65 mm; Supplier 1: Digi-Key; Supplier Part Number 1: ADS8345EE4-ND; Digital Supply(Max)(V): 5.5; Digital Supply(Min)(V): 2.7; Eco-Plan: Green (RoHS & no Sb/Br); Mounting Technology: Surface Mount; Code_JEDEC: MO-153; ComponentLink1Description: Manufacturer URL; ComponentLink1URL: http://www.ti.com/; ComponentLink2Description: Datasheet; ComponentLink2URL: http://www.ti.com/general/docs/lit/getliterature.tsp?genericPartNumber=ADS1222&fileType=pdf; ComponentLink3Description: Package Specification; ComponentLink3URL: http://www.ti.com/litv/pdf/mpds360
footprint TI-PW14_N (SOP, 14-Leads, Body 5x4.4mm, Pitch 0.65mm, IPC Medium Density)
footprint TI-PW14_L (SOP, 14-Leads, Body 5x4.4mm, Pitch 0.65mm, IPC High Density)
footprint TI-PW14_M (SOP, 14-Leads, Body 5x4.4mm, Pitch 0.65mm, IPC Low Density)
pins: 1 VDD (power) "Analog and digital power supply", 2 SCLK (in) "Serial clock input", 3 CLK (in) "System clock input", 4 ~{DRDY}/DOUT (out) "Dual-purpose output: Data ready: indicates valid data by going low. Data output: outputs data, MSB first, on the rising edge of SCLK", 5 MUX (in) "Selects analog input of mux", 6 TEMPEN (in) "Selects temperature sensor input from mux", 7 BUFEN (in) "Enables input buffer", 8 AINP2 (in) "Analog channel 2 positive input", 9 AINN2 (in) "Analog channel 2 negative input", 10 AINP1 (in) "Analog channel 1 positive input", 11 AINN1 (in) "Analog channel 1 negative input", 12 GND (power) "Analog and digital ground", 13 VREFN (in) "Negative reference input", 14 VREFP (in) "Positive reference input"
